# Altium schematic symbol library jlcpcb_2025_04_capacitors_extended_0201.schlib: 1175 symbols (part 1 of 7)
Pins are listed as number, name and electrical type; pins without a type are passive.

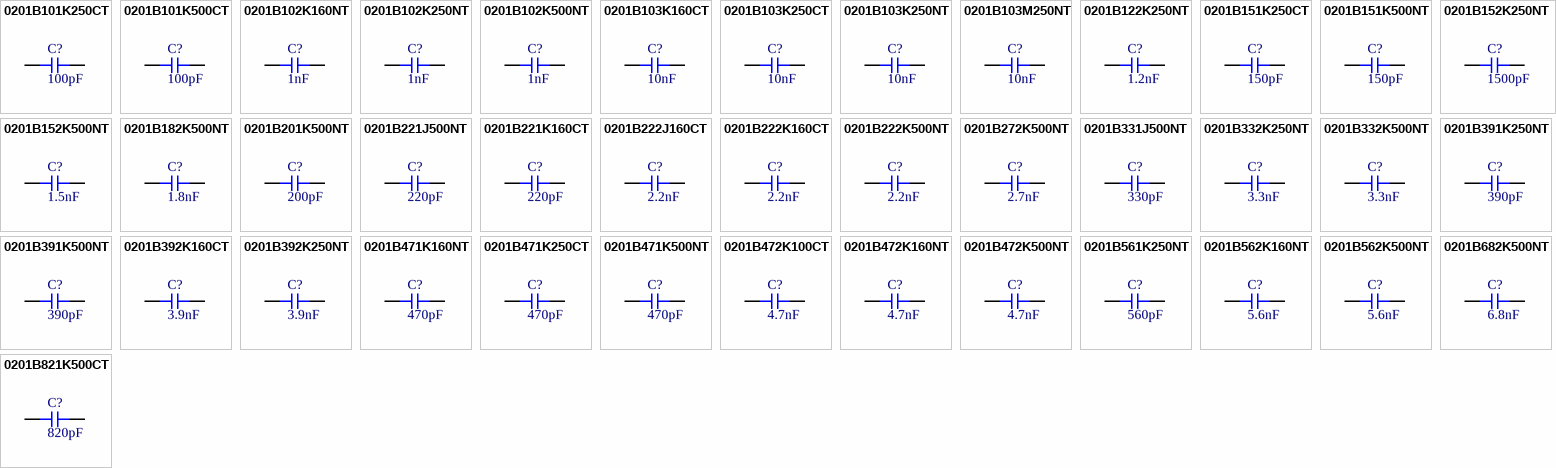
[diagram p0: symbols 0201B101K250CT to 0201B821K500CT]

## 0201B101K250CT
designator C?  Capacitance: 100pF  (hidden comment: *)
Capacitor, Ceramic (MLCC), 100pF, ±10%, 25V, X7R, ±10%, SMD 0201; Manufacturer: Walsin Tech Corp; Manufacturer Part Number: 0201B101K250CT; Package Size: 0201; JLCPCB Basic Part: No; JLCPCB Part Number: C908474; Supplier 1: LCSC; Category: Capacitors - MLCC; Supplier Part Number 1: C908474; Tolerance: ±10%; Voltage Rating: 25V; Temperature Coefficient: X7R; RoHS: Yes; ComponentLink1Description: Datasheet; ComponentLink1URL: https://wmsc.lcsc.com/wmsc/upload/file/pdf/v2/lcsc/2010271806_Walsin-Tech-Corp-0201B101K250CT_C908474.pdf; ComponentLink2Description: JLCPCB Part URL; ComponentLink2URL: https://jlcpcb.com/partdetail/C908474; ComponentLink3Description: LCSC Part URL; ComponentLink3URL: https://lcsc.com/product-detail/Multilayer-Ceramic-Capacitors-MLCC---SMD-SMT_Walsin-Tech-Corp-Walsin-Tech-Corp-0201B101K250CT_C908474.html
footprint CAP-0201 (0201 (0603M) Capacitor)
pins: 1, 2

## 0201B101K500CT
designator C?  Capacitance: 100pF  (hidden comment: *)
Capacitor, Ceramic (MLCC), 100pF, ±10%, 50V, X7R, ±10%, SMD 0201; Manufacturer: Walsin Tech Corp; Manufacturer Part Number: 0201B101K500CT; Package Size: 0201; JLCPCB Basic Part: No; JLCPCB Part Number: C295893; Supplier 1: LCSC; Category: Capacitors - MLCC; Supplier Part Number 1: C295893; Tolerance: ±10%; Voltage Rating: 50V; Temperature Coefficient: X7R; RoHS: Yes; ComponentLink1Description: Datasheet; ComponentLink1URL: https://wmsc.lcsc.com/wmsc/upload/file/pdf/v2/lcsc/2304140030_Walsin-Tech-Corp-0201B101K500CT_C295893.pdf; ComponentLink2Description: JLCPCB Part URL; ComponentLink2URL: https://jlcpcb.com/partdetail/C295893; ComponentLink3Description: LCSC Part URL; ComponentLink3URL: https://lcsc.com/product-detail/Multilayer-Ceramic-Capacitors-MLCC---SMD-SMT_Walsin-Tech-Corp-Walsin-Tech-Corp-0201B101K500CT_C295893.html
footprint CAP-0201 (0201 (0603M) Capacitor)
pins: 1, 2

## 0201B102K160NT
designator C?  Capacitance: 1nF  (hidden comment: *)
Capacitor, Ceramic (MLCC), 1nF, 16V, X7R, SMD 0201; Manufacturer: FH (Guangdong Fenghua Advanced Tech); Manufacturer Part Number: 0201B102K160NT; Package Size: 0201; JLCPCB Basic Part: No; JLCPCB Part Number: C2982963; Supplier 1: LCSC; Category: Capacitors - MLCC; Supplier Part Number 1: C2982963; Voltage Rating: 16V; Temperature Coefficient: X7R; RoHS: Yes; ComponentLink1Description: Datasheet; ComponentLink1URL: https://wmsc.lcsc.com/wmsc/upload/file/pdf/v2/lcsc/2204111630_FH--Guangdong-Fenghua-Advanced-Tech-0201B102K160NT_C2982963.pdf; ComponentLink2Description: JLCPCB Part URL; ComponentLink2URL: https://jlcpcb.com/partdetail/C2982963; ComponentLink3Description: LCSC Part URL; ComponentLink3URL: https://lcsc.com/product-detail/Multilayer-Ceramic-Capacitors-MLCC---SMD-SMT_FH-Guangdong-Fenghua-Advanced-Tech-FH-Guangdong-Fenghua-Advanced-Tech-0201B102K160NT_C2982963.html
footprint CAP-0201 (0201 (0603M) Capacitor)
pins: 1, 2

## 0201B102K250NT
designator C?  Capacitance: 1nF  (hidden comment: *)
Capacitor, Ceramic (MLCC), 1nF, ±10%, 25V, X7R, ±10%, SMD 0201; Manufacturer: FH (Guangdong Fenghua Advanced Tech); Manufacturer Part Number: 0201B102K250NT; Package Size: 0201; JLCPCB Basic Part: No; JLCPCB Part Number: C285176; Supplier 1: LCSC; Category: Capacitors - MLCC; Supplier Part Number 1: C285176; Tolerance: ±10%; Voltage Rating: 25V; Temperature Coefficient: X7R; RoHS: Yes; ComponentLink1Description: Datasheet; ComponentLink1URL: https://wmsc.lcsc.com/wmsc/upload/file/pdf/v2/lcsc/2304140030_FH--Guangdong-Fenghua-Advanced-Tech-0201B102K250NT_C285176.pdf; ComponentLink2Description: JLCPCB Part URL; ComponentLink2URL: https://jlcpcb.com/partdetail/C285176; ComponentLink3Description: LCSC Part URL; ComponentLink3URL: https://lcsc.com/product-detail/Multilayer-Ceramic-Capacitors-MLCC---SMD-SMT_FH-Guangdong-Fenghua-Advanced-Tech-FH-Guangdong-Fenghua-Advanced-Tech-0201B102K250NT_C285176.html
footprint CAP-0201 (0201 (0603M) Capacitor)
pins: 1, 2

## 0201B102K500NT
designator C?  Capacitance: 1nF  (hidden comment: *)
Capacitor, Ceramic (MLCC), 1nF, ±10%, 50V, X7R, ±10%, SMD 0201; Manufacturer: FH(Guangdong Fenghua Advanced Tech); Manufacturer Part Number: 0201B102K500NT; Package Size: 0201; JLCPCB Basic Part: No; JLCPCB Part Number: C66942; Supplier 1: LCSC; Category: Capacitors - MLCC; Supplier Part Number 1: C66942; Tolerance: ±10%; Voltage Rating: 50V; Temperature Coefficient: X7R; RoHS: Yes; ComponentLink1Description: Datasheet; ComponentLink1URL: https://wmsc.lcsc.com/wmsc/upload/file/pdf/v2/lcsc/2304140030_FH--Guangdong-Fenghua-Advanced-Tech-0201B102K500NT_C66942.pdf; ComponentLink2Description: JLCPCB Part URL; ComponentLink2URL: https://jlcpcb.com/partdetail/C66942; ComponentLink3Description: LCSC Part URL; ComponentLink3URL: https://lcsc.com/product-detail/Multilayer-Ceramic-Capacitors-MLCC---SMD-SMT_FH-Guangdong-Fenghua-Advanced-Tech-FH-Guangdong-Fenghua-Advanced-Tech-0201B102K500NT_C66942.html
footprint CAP-0201 (0201 (0603M) Capacitor)
pins: 1, 2

## 0201B103K160CT
designator C?  Capacitance: 10nF  (hidden comment: *)
Capacitor, Ceramic (MLCC), 10nF, ±10%, 16V, X7R, ±10%, SMD 0201; Manufacturer: Walsin Tech Corp; Manufacturer Part Number: 0201B103K160CT; Package Size: 0201; JLCPCB Basic Part: No; JLCPCB Part Number: C301892; Supplier 1: LCSC; Category: Capacitors - MLCC; Supplier Part Number 1: C301892; Tolerance: ±10%; Voltage Rating: 16V; Temperature Coefficient: X7R; RoHS: Yes; ComponentLink1Description: Datasheet; ComponentLink1URL: https://wmsc.lcsc.com/wmsc/upload/file/pdf/v2/lcsc/2304140030_Walsin-Tech-Corp-0201B103K160CT_C301892.pdf; ComponentLink2Description: JLCPCB Part URL; ComponentLink2URL: https://jlcpcb.com/partdetail/C301892; ComponentLink3Description: LCSC Part URL; ComponentLink3URL: https://lcsc.com/product-detail/Multilayer-Ceramic-Capacitors-MLCC---SMD-SMT_Walsin-Tech-Corp-Walsin-Tech-Corp-0201B103K160CT_C301892.html
footprint CAP-0201 (0201 (0603M) Capacitor)
pins: 1, 2

## 0201B103K250CT
designator C?  Capacitance: 10nF  (hidden comment: *)
Capacitor, Ceramic (MLCC), 10nF, ±10%, 25V, X7R, ±10%, SMD 0201; Manufacturer: Walsin Tech Corp; Manufacturer Part Number: 0201B103K250CT; Package Size: 0201; JLCPCB Basic Part: No; JLCPCB Part Number: C880757; Supplier 1: LCSC; Category: Capacitors - MLCC; Supplier Part Number 1: C880757; Tolerance: ±10%; Voltage Rating: 25V; Temperature Coefficient: X7R; RoHS: Yes; ComponentLink1Description: Datasheet; ComponentLink1URL: https://wmsc.lcsc.com/wmsc/upload/file/pdf/v2/lcsc/2304140030_Walsin-Tech-Corp-0201B103K250CT_C880757.pdf; ComponentLink2Description: JLCPCB Part URL; ComponentLink2URL: https://jlcpcb.com/partdetail/C880757; ComponentLink3Description: LCSC Part URL; ComponentLink3URL: https://lcsc.com/product-detail/Multilayer-Ceramic-Capacitors-MLCC---SMD-SMT_Walsin-Tech-Corp-Walsin-Tech-Corp-0201B103K250CT_C880757.html
footprint CAP-0201 (0201 (0603M) Capacitor)
pins: 1, 2

## 0201B103K250NT
designator C?  Capacitance: 10nF  (hidden comment: *)
Capacitor, Ceramic (MLCC), 10nF, ±10%, 25V, X7R, ±10%, SMD 0201; Manufacturer: FH(Guangdong Fenghua Advanced Tech); Manufacturer Part Number: 0201B103K250NT; Package Size: 0201; JLCPCB Basic Part: No; JLCPCB Part Number: C285010; Supplier 1: LCSC; Category: Capacitors - MLCC; Supplier Part Number 1: C285010; Tolerance: ±10%; Voltage Rating: 25V; Temperature Coefficient: X7R; RoHS: Yes; ComponentLink1Description: Datasheet; ComponentLink1URL: https://wmsc.lcsc.com/wmsc/upload/file/pdf/v2/lcsc/2304140030_FH--Guangdong-Fenghua-Advanced-Tech-0201B103K250NT_C285010.pdf; ComponentLink2Description: JLCPCB Part URL; ComponentLink2URL: https://jlcpcb.com/partdetail/C285010; ComponentLink3Description: LCSC Part URL; ComponentLink3URL: https://lcsc.com/product-detail/Multilayer-Ceramic-Capacitors-MLCC---SMD-SMT_FH-Guangdong-Fenghua-Advanced-Tech-FH-Guangdong-Fenghua-Advanced-Tech-0201B103K250NT_C285010.html
footprint CAP-0201 (0201 (0603M) Capacitor)
pins: 1, 2

## 0201B103M250NT
designator C?  Capacitance: 10nF  (hidden comment: *)
Capacitor, Ceramic (MLCC), 10nF, ±20%, 25V, X7R, ±20%, SMD 0201; Manufacturer: FH (Guangdong Fenghua Advanced Tech); Manufacturer Part Number: 0201B103M250NT; Package Size: 0201; JLCPCB Basic Part: No; JLCPCB Part Number: C301893; Supplier 1: LCSC; Category: Capacitors - MLCC; Supplier Part Number 1: C301893; Tolerance: ±20%; Voltage Rating: 25V; Temperature Coefficient: X7R; RoHS: Yes; ComponentLink1Description: Datasheet; ComponentLink1URL: https://wmsc.lcsc.com/wmsc/upload/file/pdf/v2/lcsc/2304140030_FH--Guangdong-Fenghua-Advanced-Tech-0201B103M250NT_C301893.pdf; ComponentLink2Description: JLCPCB Part URL; ComponentLink2URL: https://jlcpcb.com/partdetail/C301893; ComponentLink3Description: LCSC Part URL; ComponentLink3URL: https://lcsc.com/product-detail/Multilayer-Ceramic-Capacitors-MLCC---SMD-SMT_FH-Guangdong-Fenghua-Advanced-Tech-FH-Guangdong-Fenghua-Advanced-Tech-0201B103M250NT_C301893.html
footprint CAP-0201 (0201 (0603M) Capacitor)
pins: 1, 2

## 0201B122K250NT
designator C?  Capacitance: 1.2nF  (hidden comment: *)
Capacitor, Ceramic (MLCC), 1.2nF, ±10%, 25V, X7R, ±10%, SMD 0201; Manufacturer: FH (Guangdong Fenghua Advanced Tech); Manufacturer Part Number: 0201B122K250NT; Package Size: 0201; JLCPCB Basic Part: No; JLCPCB Part Number: C3037634; Supplier 1: LCSC; Category: Capacitors - MLCC; Supplier Part Number 1: C3037634; Tolerance: ±10%; Voltage Rating: 25V; Temperature Coefficient: X7R; RoHS: Yes; ComponentLink1Description: Datasheet; ComponentLink1URL: https://wmsc.lcsc.com/wmsc/upload/file/pdf/v2/lcsc/2206171645_FH--Guangdong-Fenghua-Advanced-Tech-0201B122K250NT_C3037634.pdf; ComponentLink2Description: JLCPCB Part URL; ComponentLink2URL: https://jlcpcb.com/partdetail/C3037634; ComponentLink3Description: LCSC Part URL; ComponentLink3URL: https://lcsc.com/product-detail/Multilayer-Ceramic-Capacitors-MLCC---SMD-SMT_FH-Guangdong-Fenghua-Advanced-Tech-FH-Guangdong-Fenghua-Advanced-Tech-0201B122K250NT_C3037634.html
footprint CAP-0201 (0201 (0603M) Capacitor)
pins: 1, 2

## 0201B151K250CT
designator C?  Capacitance: 150pF  (hidden comment: *)
Capacitor, Ceramic (MLCC), 150pF, ±10%, 25V, X7R, ±10%, SMD 0201; Manufacturer: Walsin Tech Corp; Manufacturer Part Number: 0201B151K250CT; Package Size: 0201; JLCPCB Basic Part: No; JLCPCB Part Number: C880867; Supplier 1: LCSC; Category: Capacitors - MLCC; Supplier Part Number 1: C880867; Tolerance: ±10%; Voltage Rating: 25V; Temperature Coefficient: X7R; RoHS: Yes; ComponentLink1Description: Datasheet; ComponentLink1URL: https://wmsc.lcsc.com/wmsc/upload/file/pdf/v2/lcsc/2304140030_Walsin-Tech-Corp-0201B151K250CT_C880867.pdf; ComponentLink2Description: JLCPCB Part URL; ComponentLink2URL: https://jlcpcb.com/partdetail/C880867; ComponentLink3Description: LCSC Part URL; ComponentLink3URL: https://lcsc.com/product-detail/Multilayer-Ceramic-Capacitors-MLCC---SMD-SMT_Walsin-Tech-Corp-Walsin-Tech-Corp-0201B151K250CT_C880867.html
footprint CAP-0201 (0201 (0603M) Capacitor)
pins: 1, 2

## 0201B151K500NT
designator C?  Capacitance: 150pF  (hidden comment: *)
Capacitor, Ceramic (MLCC), 150pF, ±10%, 50V, ±10%, SMD 0201; Manufacturer: FH(Guangdong Fenghua Advanced Tech); Manufacturer Part Number: 0201B151K500NT; Package Size: 0201; JLCPCB Basic Part: No; JLCPCB Part Number: C1322342; Supplier 1: LCSC; Category: Capacitors - MLCC; Supplier Part Number 1: C1322342; Tolerance: ±10%; Voltage Rating: 50V; RoHS: Yes; ComponentLink1Description: Datasheet; ComponentLink1URL: https://wmsc.lcsc.com/wmsc/upload/file/pdf/v2/lcsc/2304140030_FH--Guangdong-Fenghua-Advanced-Tech-0201B151K500NT_C1322342.pdf; ComponentLink2Description: JLCPCB Part URL; ComponentLink2URL: https://jlcpcb.com/partdetail/C1322342; ComponentLink3Description: LCSC Part URL; ComponentLink3URL: https://lcsc.com/product-detail/Multilayer-Ceramic-Capacitors-MLCC---SMD-SMT_FH-Guangdong-Fenghua-Advanced-Tech-FH-Guangdong-Fenghua-Advanced-Tech-0201B151K500NT_C1322342.html
footprint CAP-0201 (0201 (0603M) Capacitor)
pins: 1, 2

## 0201B152K250NT
designator C?  Capacitance: 1500pF  (hidden comment: *)
Capacitor, Ceramic (MLCC), 1500pF, ±10%, 25V, X7R, ±10%, SMD 0201; Manufacturer: FH (Guangdong Fenghua Advanced Tech); Manufacturer Part Number: 0201B152K250NT; Package Size: 0201; JLCPCB Basic Part: No; JLCPCB Part Number: C913865; Supplier 1: LCSC; Category: Capacitors - MLCC; Supplier Part Number 1: C913865; Tolerance: ±10%; Voltage Rating: 25V; Temperature Coefficient: X7R; RoHS: Yes; ComponentLink1Description: Datasheet; ComponentLink1URL: https://wmsc.lcsc.com/wmsc/upload/file/pdf/v2/lcsc/2304140030_FH--Guangdong-Fenghua-Advanced-Tech-0201B152K250NT_C913865.pdf; ComponentLink2Description: JLCPCB Part URL; ComponentLink2URL: https://jlcpcb.com/partdetail/C913865; ComponentLink3Description: LCSC Part URL; ComponentLink3URL: https://lcsc.com/product-detail/Multilayer-Ceramic-Capacitors-MLCC---SMD-SMT_FH-Guangdong-Fenghua-Advanced-Tech-FH-Guangdong-Fenghua-Advanced-Tech-0201B152K250NT_C913865.html
footprint CAP-0201 (0201 (0603M) Capacitor)
pins: 1, 2

## 0201B152K500NT
designator C?  Capacitance: 1.5nF  (hidden comment: *)
Capacitor, Ceramic (MLCC), 1.5nF, ±10%, 50V, X7R, ±10%, SMD 0201; Manufacturer: FH (Guangdong Fenghua Advanced Tech); Manufacturer Part Number: 0201B152K500NT; Package Size: 0201; JLCPCB Basic Part: No; JLCPCB Part Number: C285104; Supplier 1: LCSC; Category: Capacitors - MLCC; Supplier Part Number 1: C285104; Tolerance: ±10%; Voltage Rating: 50V; Temperature Coefficient: X7R; RoHS: Yes; ComponentLink1Description: Datasheet; ComponentLink1URL: https://wmsc.lcsc.com/wmsc/upload/file/pdf/v2/lcsc/2304140030_FH--Guangdong-Fenghua-Advanced-Tech-0201B152K500NT_C285104.pdf; ComponentLink2Description: JLCPCB Part URL; ComponentLink2URL: https://jlcpcb.com/partdetail/C285104; ComponentLink3Description: LCSC Part URL; ComponentLink3URL: https://lcsc.com/product-detail/Multilayer-Ceramic-Capacitors-MLCC---SMD-SMT_FH-Guangdong-Fenghua-Advanced-Tech-FH-Guangdong-Fenghua-Advanced-Tech-0201B152K500NT_C285104.html
footprint CAP-0201 (0201 (0603M) Capacitor)
pins: 1, 2

## 0201B182K500NT
designator C?  Capacitance: 1.8nF  (hidden comment: *)
Capacitor, Ceramic (MLCC), 1.8nF, 50V, SMD 0201; Manufacturer: FH (Guangdong Fenghua Advanced Tech); Manufacturer Part Number: 0201B182K500NT; Package Size: 0201; JLCPCB Basic Part: No; JLCPCB Part Number: C2857956; Supplier 1: LCSC; Category: Capacitors - MLCC; Supplier Part Number 1: C2857956; Voltage Rating: 50V; RoHS: Yes; ComponentLink1Description: Datasheet; ComponentLink2Description: JLCPCB Part URL; ComponentLink2URL: https://jlcpcb.com/partdetail/C2857956; ComponentLink3Description: LCSC Part URL; ComponentLink3URL: https://lcsc.com/product-detail/Multilayer-Ceramic-Capacitors-MLCC---SMD-SMT_FH-Guangdong-Fenghua-Advanced-Tech-FH-Guangdong-Fenghua-Advanced-Tech-0201B182K500NT_C2857956.html
footprint CAP-0201 (0201 (0603M) Capacitor)
pins: 1, 2

## 0201B201K500NT
designator C?  Capacitance: 200pF  (hidden comment: *)
Capacitor, Ceramic (MLCC), 200pF, 50V, SMD 0201; Manufacturer: FH (Guangdong Fenghua Advanced Tech); Manufacturer Part Number: 0201B201K500NT; Package Size: 0201; JLCPCB Basic Part: No; JLCPCB Part Number: C2857957; Supplier 1: LCSC; Category: Capacitors - MLCC; Supplier Part Number 1: C2857957; Voltage Rating: 50V; RoHS: Yes; ComponentLink1Description: Datasheet; ComponentLink2Description: JLCPCB Part URL; ComponentLink2URL: https://jlcpcb.com/partdetail/C2857957; ComponentLink3Description: LCSC Part URL; ComponentLink3URL: https://lcsc.com/product-detail/Multilayer-Ceramic-Capacitors-MLCC---SMD-SMT_FH-Guangdong-Fenghua-Advanced-Tech-FH-Guangdong-Fenghua-Advanced-Tech-0201B201K500NT_C2857957.html
footprint CAP-0201 (0201 (0603M) Capacitor)
pins: 1, 2

## 0201B221J500NT
designator C?  Capacitance: 220pF  (hidden comment: *)
Capacitor, Ceramic (MLCC), 220pF, 50V, SMD 0201; Manufacturer: FH (Guangdong Fenghua Advanced Tech); Manufacturer Part Number: 0201B221J500NT; Package Size: 0201; JLCPCB Basic Part: No; JLCPCB Part Number: C2857958; Supplier 1: LCSC; Category: Capacitors - MLCC; Supplier Part Number 1: C2857958; Voltage Rating: 50V; RoHS: Yes; ComponentLink1Description: Datasheet; ComponentLink2Description: JLCPCB Part URL; ComponentLink2URL: https://jlcpcb.com/partdetail/C2857958; ComponentLink3Description: LCSC Part URL; ComponentLink3URL: https://lcsc.com/product-detail/Multilayer-Ceramic-Capacitors-MLCC---SMD-SMT_FH-Guangdong-Fenghua-Advanced-Tech-FH-Guangdong-Fenghua-Advanced-Tech-0201B221J500NT_C2857958.html
footprint CAP-0201 (0201 (0603M) Capacitor)
pins: 1, 2

## 0201B221K160CT
designator C?  Capacitance: 220pF  (hidden comment: *)
Capacitor, Ceramic (MLCC), 220pF, ±10%, 16V, X7R, ±10%, SMD 0201; Manufacturer: Walsin Tech Corp; Manufacturer Part Number: 0201B221K160CT; Package Size: 0201; JLCPCB Basic Part: No; JLCPCB Part Number: C384834; Supplier 1: LCSC; Category: Capacitors - MLCC; Supplier Part Number 1: C384834; Tolerance: ±10%; Voltage Rating: 16V; Temperature Coefficient: X7R; RoHS: Yes; ComponentLink1Description: Datasheet; ComponentLink1URL: https://wmsc.lcsc.com/wmsc/upload/file/pdf/v2/lcsc/2304140030_Walsin-Tech-Corp-0201B221K160CT_C384834.pdf; ComponentLink2Description: JLCPCB Part URL; ComponentLink2URL: https://jlcpcb.com/partdetail/C384834; ComponentLink3Description: LCSC Part URL; ComponentLink3URL: https://lcsc.com/product-detail/Multilayer-Ceramic-Capacitors-MLCC---SMD-SMT_Walsin-Tech-Corp-Walsin-Tech-Corp-0201B221K160CT_C384834.html
footprint CAP-0201 (0201 (0603M) Capacitor)
pins: 1, 2

## 0201B222J160CT
designator C?  Capacitance: 2.2nF  (hidden comment: *)
Capacitor, Ceramic (MLCC), 2.2nF, ±5%, 16V, X7R, ±5%, SMD 0201; Manufacturer: Walsin Tech Corp; Manufacturer Part Number: 0201B222J160CT; Package Size: 0201; JLCPCB Basic Part: No; JLCPCB Part Number: C458607; Supplier 1: LCSC; Category: Capacitors - MLCC; Supplier Part Number 1: C458607; Tolerance: ±5%; Voltage Rating: 16V; Temperature Coefficient: X7R; RoHS: Yes; ComponentLink1Description: Datasheet; ComponentLink1URL: https://wmsc.lcsc.com/wmsc/upload/file/pdf/v2/lcsc/2304140030_Walsin-Tech-Corp-0201B222J160CT_C458607.pdf; ComponentLink2Description: JLCPCB Part URL; ComponentLink2URL: https://jlcpcb.com/partdetail/C458607; ComponentLink3Description: LCSC Part URL; ComponentLink3URL: https://lcsc.com/product-detail/Multilayer-Ceramic-Capacitors-MLCC---SMD-SMT_Walsin-Tech-Corp-Walsin-Tech-Corp-0201B222J160CT_C458607.html
footprint CAP-0201 (0201 (0603M) Capacitor)
pins: 1, 2

## 0201B222K160CT
designator C?  Capacitance: 2.2nF  (hidden comment: *)
Capacitor, Ceramic (MLCC), 2.2nF, ±10%, 16V, X7R, ±10%, SMD 0201; Manufacturer: Walsin Tech Corp; Manufacturer Part Number: 0201B222K160CT; Package Size: 0201; JLCPCB Basic Part: No; JLCPCB Part Number: C340652; Supplier 1: LCSC; Category: Capacitors - MLCC; Supplier Part Number 1: C340652; Tolerance: ±10%; Voltage Rating: 16V; Temperature Coefficient: X7R; RoHS: Yes; ComponentLink1Description: Datasheet; ComponentLink1URL: https://wmsc.lcsc.com/wmsc/upload/file/pdf/v2/lcsc/2304140030_Walsin-Tech-Corp-0201B222K160CT_C340652.pdf; ComponentLink2Description: JLCPCB Part URL; ComponentLink2URL: https://jlcpcb.com/partdetail/C340652; ComponentLink3Description: LCSC Part URL; ComponentLink3URL: https://lcsc.com/product-detail/Multilayer-Ceramic-Capacitors-MLCC---SMD-SMT_Walsin-Tech-Corp-Walsin-Tech-Corp-0201B222K160CT_C340652.html
footprint CAP-0201 (0201 (0603M) Capacitor)
pins: 1, 2

## 0201B222K500NT
designator C?  Capacitance: 2.2nF  (hidden comment: *)
Capacitor, Ceramic (MLCC), 2.2nF, ±10%, 50V, X7R, ±10%, SMD 0201; Manufacturer: FH (Guangdong Fenghua Advanced Tech); Manufacturer Part Number: 0201B222K500NT; Package Size: 0201; JLCPCB Basic Part: No; JLCPCB Part Number: C80433; Supplier 1: LCSC; Category: Capacitors - MLCC; Supplier Part Number 1: C80433; Tolerance: ±10%; Voltage Rating: 50V; Temperature Coefficient: X7R; RoHS: Yes; ComponentLink1Description: Datasheet; ComponentLink1URL: https://wmsc.lcsc.com/wmsc/upload/file/pdf/v2/lcsc/2304140030_FH--Guangdong-Fenghua-Advanced-Tech-0201B222K500NT_C80433.pdf; ComponentLink2Description: JLCPCB Part URL; ComponentLink2URL: https://jlcpcb.com/partdetail/C80433; ComponentLink3Description: LCSC Part URL; ComponentLink3URL: https://lcsc.com/product-detail/Multilayer-Ceramic-Capacitors-MLCC---SMD-SMT_FH-Guangdong-Fenghua-Advanced-Tech-FH-Guangdong-Fenghua-Advanced-Tech-0201B222K500NT_C80433.html
footprint CAP-0201 (0201 (0603M) Capacitor)
pins: 1, 2

## 0201B272K500NT
designator C?  Capacitance: 2.7nF  (hidden comment: *)
Capacitor, Ceramic (MLCC), 2.7nF, ±10%, 50V, X7R, ±10%, SMD 0201; Manufacturer: FH (Guangdong Fenghua Advanced Tech); Manufacturer Part Number: 0201B272K500NT; Package Size: 0201; JLCPCB Basic Part: No; JLCPCB Part Number: C3037620; Supplier 1: LCSC; Category: Capacitors - MLCC; Supplier Part Number 1: C3037620; Tolerance: ±10%; Voltage Rating: 50V; Temperature Coefficient: X7R; RoHS: Yes; ComponentLink1Description: Datasheet; ComponentLink1URL: https://wmsc.lcsc.com/wmsc/upload/file/pdf/v2/lcsc/2206282015_FH--Guangdong-Fenghua-Advanced-Tech-0201B272K500NT_C3037620.pdf; ComponentLink2Description: JLCPCB Part URL; ComponentLink2URL: https://jlcpcb.com/partdetail/C3037620; ComponentLink3Description: LCSC Part URL; ComponentLink3URL: https://lcsc.com/product-detail/Multilayer-Ceramic-Capacitors-MLCC---SMD-SMT_FH-Guangdong-Fenghua-Advanced-Tech-FH-Guangdong-Fenghua-Advanced-Tech-0201B272K500NT_C3037620.html
footprint CAP-0201 (0201 (0603M) Capacitor)
pins: 1, 2

## 0201B331J500NT
designator C?  Capacitance: 330pF  (hidden comment: *)
Capacitor, Ceramic (MLCC), 330pF, ±5%, 50V, X7R, ±5%, SMD 0201; Manufacturer: FH (Guangdong Fenghua Advanced Tech); Manufacturer Part Number: 0201B331J500NT; Package Size: 0201; JLCPCB Basic Part: No; JLCPCB Part Number: C2857959; Supplier 1: LCSC; Category: Capacitors - MLCC; Supplier Part Number 1: C2857959; Tolerance: ±5%; Voltage Rating: 50V; Temperature Coefficient: X7R; RoHS: Yes; ComponentLink1Description: Datasheet; ComponentLink2Description: JLCPCB Part URL; ComponentLink2URL: https://jlcpcb.com/partdetail/C2857959; ComponentLink3Description: LCSC Part URL; ComponentLink3URL: https://lcsc.com/product-detail/Multilayer-Ceramic-Capacitors-MLCC---SMD-SMT_FH-Guangdong-Fenghua-Advanced-Tech-FH-Guangdong-Fenghua-Advanced-Tech-0201B331J500NT_C2857959.html
footprint CAP-0201 (0201 (0603M) Capacitor)
pins: 1, 2

## 0201B332K250NT
designator C?  Capacitance: 3.3nF  (hidden comment: *)
Capacitor, Ceramic (MLCC), 3.3nF, ±10%, 25V, X7R, ±10%, SMD 0201; Manufacturer: FH (Guangdong Fenghua Advanced Tech); Manufacturer Part Number: 0201B332K250NT; Package Size: 0201; JLCPCB Basic Part: No; JLCPCB Part Number: C3037621; Supplier 1: LCSC; Category: Capacitors - MLCC; Supplier Part Number 1: C3037621; Tolerance: ±10%; Voltage Rating: 25V; Temperature Coefficient: X7R; RoHS: Yes; ComponentLink1Description: Datasheet; ComponentLink1URL: https://wmsc.lcsc.com/wmsc/upload/file/pdf/v2/lcsc/2206282015_FH--Guangdong-Fenghua-Advanced-Tech-0201B332K250NT_C3037621.pdf; ComponentLink2Description: JLCPCB Part URL; ComponentLink2URL: https://jlcpcb.com/partdetail/C3037621; ComponentLink3Description: LCSC Part URL; ComponentLink3URL: https://lcsc.com/product-detail/Multilayer-Ceramic-Capacitors-MLCC---SMD-SMT_FH-Guangdong-Fenghua-Advanced-Tech-FH-Guangdong-Fenghua-Advanced-Tech-0201B332K250NT_C3037621.html
footprint CAP-0201 (0201 (0603M) Capacitor)
pins: 1, 2

## 0201B332K500NT
designator C?  Capacitance: 3.3nF  (hidden comment: *)
Capacitor, Ceramic (MLCC), 3.3nF, ±10%, 50V, X7R, ±10%, SMD 0201; Manufacturer: FH (Guangdong Fenghua Advanced Tech); Manufacturer Part Number: 0201B332K500NT; Package Size: 0201; JLCPCB Basic Part: No; JLCPCB Part Number: C285110; Supplier 1: LCSC; Category: Capacitors - MLCC; Supplier Part Number 1: C285110; Tolerance: ±10%; Voltage Rating: 50V; Temperature Coefficient: X7R; RoHS: Yes; ComponentLink1Description: Datasheet; ComponentLink1URL: https://wmsc.lcsc.com/wmsc/upload/file/pdf/v2/lcsc/2304140030_FH--Guangdong-Fenghua-Advanced-Tech-0201B332K500NT_C285110.pdf; ComponentLink2Description: JLCPCB Part URL; ComponentLink2URL: https://jlcpcb.com/partdetail/C285110; ComponentLink3Description: LCSC Part URL; ComponentLink3URL: https://lcsc.com/product-detail/Multilayer-Ceramic-Capacitors-MLCC---SMD-SMT_FH-Guangdong-Fenghua-Advanced-Tech-FH-Guangdong-Fenghua-Advanced-Tech-0201B332K500NT_C285110.html
footprint CAP-0201 (0201 (0603M) Capacitor)
pins: 1, 2

## 0201B391K250NT
designator C?  Capacitance: 390pF  (hidden comment: *)
Capacitor, Ceramic (MLCC), 390pF, ±10%, 25V, X7R, ±10%, SMD 0201; Manufacturer: FH (Guangdong Fenghua Advanced Tech); Manufacturer Part Number: 0201B391K250NT; Package Size: 0201; JLCPCB Basic Part: No; JLCPCB Part Number: C2991595; Supplier 1: LCSC; Category: Capacitors - MLCC; Supplier Part Number 1: C2991595; Tolerance: ±10%; Voltage Rating: 25V; Temperature Coefficient: X7R; RoHS: Yes; ComponentLink1Description: Datasheet; ComponentLink1URL: https://wmsc.lcsc.com/wmsc/upload/file/pdf/v2/lcsc/2204111630_FH--Guangdong-Fenghua-Advanced-Tech-0201B391K250NT_C2991595.pdf; ComponentLink2Description: JLCPCB Part URL; ComponentLink2URL: https://jlcpcb.com/partdetail/C2991595; ComponentLink3Description: LCSC Part URL; ComponentLink3URL: https://lcsc.com/product-detail/Multilayer-Ceramic-Capacitors-MLCC---SMD-SMT_FH-Guangdong-Fenghua-Advanced-Tech-FH-Guangdong-Fenghua-Advanced-Tech-0201B391K250NT_C2991595.html
footprint CAP-0201 (0201 (0603M) Capacitor)
pins: 1, 2

## 0201B391K500NT
designator C?  Capacitance: 390pF  (hidden comment: *)
Capacitor, Ceramic (MLCC), 390pF, ±10%, 50V, X7R, ±10%, SMD 0201; Manufacturer: FH (Guangdong Fenghua Advanced Tech); Manufacturer Part Number: 0201B391K500NT; Package Size: 0201; JLCPCB Basic Part: No; JLCPCB Part Number: C507065; Supplier 1: LCSC; Category: Capacitors - MLCC; Supplier Part Number 1: C507065; Tolerance: ±10%; Voltage Rating: 50V; Temperature Coefficient: X7R; RoHS: Yes; ComponentLink1Description: Datasheet; ComponentLink1URL: https://wmsc.lcsc.com/wmsc/upload/file/pdf/v2/lcsc/2304140030_FH--Guangdong-Fenghua-Advanced-Tech-0201B391K500NT_C507065.pdf; ComponentLink2Description: JLCPCB Part URL; ComponentLink2URL: https://jlcpcb.com/partdetail/C507065; ComponentLink3Description: LCSC Part URL; ComponentLink3URL: https://lcsc.com/product-detail/Multilayer-Ceramic-Capacitors-MLCC---SMD-SMT_FH-Guangdong-Fenghua-Advanced-Tech-FH-Guangdong-Fenghua-Advanced-Tech-0201B391K500NT_C507065.html
footprint CAP-0201 (0201 (0603M) Capacitor)
pins: 1, 2

## 0201B392K160CT
designator C?  Capacitance: 3.9nF  (hidden comment: *)
Capacitor, Ceramic (MLCC), 3.9nF, ±10%, 16V, X7R, ±10%, SMD 0201; Manufacturer: Walsin Tech Corp; Manufacturer Part Number: 0201B392K160CT; Package Size: 0201; JLCPCB Basic Part: No; JLCPCB Part Number: C387910; Supplier 1: LCSC; Category: Capacitors - MLCC; Supplier Part Number 1: C387910; Tolerance: ±10%; Voltage Rating: 16V; Temperature Coefficient: X7R; RoHS: Yes; ComponentLink1Description: Datasheet; ComponentLink1URL: https://wmsc.lcsc.com/wmsc/upload/file/pdf/v2/lcsc/2304140030_Walsin-Tech-Corp-0201B392K160CT_C387910.pdf; ComponentLink2Description: JLCPCB Part URL; ComponentLink2URL: https://jlcpcb.com/partdetail/C387910; ComponentLink3Description: LCSC Part URL; ComponentLink3URL: https://lcsc.com/product-detail/Multilayer-Ceramic-Capacitors-MLCC---SMD-SMT_Walsin-Tech-Corp-Walsin-Tech-Corp-0201B392K160CT_C387910.html
footprint CAP-0201 (0201 (0603M) Capacitor)
pins: 1, 2

## 0201B392K250NT
designator C?  Capacitance: 3.9nF  (hidden comment: *)
Capacitor, Ceramic (MLCC), 3.9nF, ±10%, 25V, X7R, ±10%, SMD 0201; Manufacturer: FH (Guangdong Fenghua Advanced Tech); Manufacturer Part Number: 0201B392K250NT; Package Size: 0201; JLCPCB Basic Part: No; JLCPCB Part Number: C285046; Supplier 1: LCSC; Category: Capacitors - MLCC; Supplier Part Number 1: C285046; Tolerance: ±10%; Voltage Rating: 25V; Temperature Coefficient: X7R; RoHS: Yes; ComponentLink1Description: Datasheet; ComponentLink1URL: https://wmsc.lcsc.com/wmsc/upload/file/pdf/v2/lcsc/2304140030_FH--Guangdong-Fenghua-Advanced-Tech-0201B392K250NT_C285046.pdf; ComponentLink2Description: JLCPCB Part URL; ComponentLink2URL: https://jlcpcb.com/partdetail/C285046; ComponentLink3Description: LCSC Part URL; ComponentLink3URL: https://lcsc.com/product-detail/Multilayer-Ceramic-Capacitors-MLCC---SMD-SMT_FH-Guangdong-Fenghua-Advanced-Tech-FH-Guangdong-Fenghua-Advanced-Tech-0201B392K250NT_C285046.html
footprint CAP-0201 (0201 (0603M) Capacitor)
pins: 1, 2

## 0201B471K160NT
designator C?  Capacitance: 470pF  (hidden comment: *)
Capacitor, Ceramic (MLCC), 470pF, ±10%, 16V, X7R, ±10%, SMD 0201; Manufacturer: FH (Guangdong Fenghua Advanced Tech); Manufacturer Part Number: 0201B471K160NT; Package Size: 0201; JLCPCB Basic Part: No; JLCPCB Part Number: C913868; Supplier 1: LCSC; Category: Capacitors - MLCC; Supplier Part Number 1: C913868; Tolerance: ±10%; Voltage Rating: 16V; Temperature Coefficient: X7R; RoHS: Yes; ComponentLink1Description: Datasheet; ComponentLink1URL: https://wmsc.lcsc.com/wmsc/upload/file/pdf/v2/lcsc/2304140030_FH--Guangdong-Fenghua-Advanced-Tech-0201B471K160NT_C913868.pdf; ComponentLink2Description: JLCPCB Part URL; ComponentLink2URL: https://jlcpcb.com/partdetail/C913868; ComponentLink3Description: LCSC Part URL; ComponentLink3URL: https://lcsc.com/product-detail/Multilayer-Ceramic-Capacitors-MLCC---SMD-SMT_FH-Guangdong-Fenghua-Advanced-Tech-FH-Guangdong-Fenghua-Advanced-Tech-0201B471K160NT_C913868.html
footprint CAP-0201 (0201 (0603M) Capacitor)
pins: 1, 2

## 0201B471K250CT
designator C?  Capacitance: 470pF  (hidden comment: *)
Capacitor, Ceramic (MLCC), 470pF, ±10%, 25V, X7R, ±10%, SMD 0201; Manufacturer: Walsin Tech Corp; Manufacturer Part Number: 0201B471K250CT; Package Size: 0201; JLCPCB Basic Part: No; JLCPCB Part Number: C384831; Supplier 1: LCSC; Category: Capacitors - MLCC; Supplier Part Number 1: C384831; Tolerance: ±10%; Voltage Rating: 25V; Temperature Coefficient: X7R; RoHS: Yes; ComponentLink1Description: Datasheet; ComponentLink1URL: https://wmsc.lcsc.com/wmsc/upload/file/pdf/v2/lcsc/2201242230_Walsin-Tech-Corp-0201B471K250CT_C384831.pdf; ComponentLink2Description: JLCPCB Part URL; ComponentLink2URL: https://jlcpcb.com/partdetail/C384831; ComponentLink3Description: LCSC Part URL; ComponentLink3URL: https://lcsc.com/product-detail/Multilayer-Ceramic-Capacitors-MLCC---SMD-SMT_Walsin-Tech-Corp-Walsin-Tech-Corp-0201B471K250CT_C384831.html
footprint CAP-0201 (0201 (0603M) Capacitor)
pins: 1, 2

## 0201B471K500NT
designator C?  Capacitance: 470pF  (hidden comment: *)
Capacitor, Ceramic (MLCC), 470pF, ±10%, 50V, X7R, ±10%, SMD 0201; Manufacturer: FH (Guangdong Fenghua Advanced Tech); Manufacturer Part Number: 0201B471K500NT; Package Size: 0201; JLCPCB Basic Part: No; JLCPCB Part Number: C55020; Supplier 1: LCSC; Category: Capacitors - MLCC; Supplier Part Number 1: C55020; Tolerance: ±10%; Voltage Rating: 50V; Temperature Coefficient: X7R; RoHS: Yes; ComponentLink1Description: Datasheet; ComponentLink1URL: https://wmsc.lcsc.com/wmsc/upload/file/pdf/v2/lcsc/2304140030_FH--Guangdong-Fenghua-Advanced-Tech-0201B471K500NT_C55020.pdf; ComponentLink2Description: JLCPCB Part URL; ComponentLink2URL: https://jlcpcb.com/partdetail/C55020; ComponentLink3Description: LCSC Part URL; ComponentLink3URL: https://lcsc.com/product-detail/Multilayer-Ceramic-Capacitors-MLCC---SMD-SMT_FH-Guangdong-Fenghua-Advanced-Tech-FH-Guangdong-Fenghua-Advanced-Tech-0201B471K500NT_C55020.html
footprint CAP-0201 (0201 (0603M) Capacitor)
pins: 1, 2

## 0201B472K100CT
designator C?  Capacitance: 4.7nF  (hidden comment: *)
Capacitor, Ceramic (MLCC), 4.7nF, ±10%, 10V, X7R, ±10%, SMD 0201; Manufacturer: Walsin Tech Corp; Manufacturer Part Number: 0201B472K100CT; Package Size: 0201; JLCPCB Basic Part: No; JLCPCB Part Number: C396693; Supplier 1: LCSC; Category: Capacitors - MLCC; Supplier Part Number 1: C396693; Tolerance: ±10%; Voltage Rating: 10V; Temperature Coefficient: X7R; RoHS: Yes; ComponentLink1Description: Datasheet; ComponentLink1URL: https://wmsc.lcsc.com/wmsc/upload/file/pdf/v2/lcsc/2304140030_Walsin-Tech-Corp-0201B472K100CT_C396693.pdf; ComponentLink2Description: JLCPCB Part URL; ComponentLink2URL: https://jlcpcb.com/partdetail/C396693; ComponentLink3Description: LCSC Part URL; ComponentLink3URL: https://lcsc.com/product-detail/Multilayer-Ceramic-Capacitors-MLCC---SMD-SMT_Walsin-Tech-Corp-Walsin-Tech-Corp-0201B472K100CT_C396693.html
footprint CAP-0201 (0201 (0603M) Capacitor)
pins: 1, 2

## 0201B472K160NT
designator C?  Capacitance: 4.7nF  (hidden comment: *)
Capacitor, Ceramic (MLCC), 4.7nF, ±10%, 16V, X7R, ±10%, SMD 0201; Manufacturer: FH (Guangdong Fenghua Advanced Tech); Manufacturer Part Number: 0201B472K160NT; Package Size: 0201; JLCPCB Basic Part: No; JLCPCB Part Number: C336629; Supplier 1: LCSC; Category: Capacitors - MLCC; Supplier Part Number 1: C336629; Tolerance: ±10%; Voltage Rating: 16V; Temperature Coefficient: X7R; RoHS: Yes; ComponentLink1Description: Datasheet; ComponentLink1URL: https://wmsc.lcsc.com/wmsc/upload/file/pdf/v2/lcsc/2304140030_FH--Guangdong-Fenghua-Advanced-Tech-0201B472K160NT_C336629.pdf; ComponentLink2Description: JLCPCB Part URL; ComponentLink2URL: https://jlcpcb.com/partdetail/C336629; ComponentLink3Description: LCSC Part URL; ComponentLink3URL: https://lcsc.com/product-detail/Multilayer-Ceramic-Capacitors-MLCC---SMD-SMT_FH-Guangdong-Fenghua-Advanced-Tech-FH-Guangdong-Fenghua-Advanced-Tech-0201B472K160NT_C336629.html
footprint CAP-0201 (0201 (0603M) Capacitor)
pins: 1, 2

## 0201B472K500NT
designator C?  Capacitance: 4.7nF  (hidden comment: *)
Capacitor, Ceramic (MLCC), 4.7nF, ±10%, 50V, X7R, ±10%, SMD 0201; Manufacturer: FH (Guangdong Fenghua Advanced Tech); Manufacturer Part Number: 0201B472K500NT; Package Size: 0201; JLCPCB Basic Part: No; JLCPCB Part Number: C66943; Supplier 1: LCSC; Category: Capacitors - MLCC; Supplier Part Number 1: C66943; Tolerance: ±10%; Voltage Rating: 50V; Temperature Coefficient: X7R; RoHS: Yes; ComponentLink1Description: Datasheet; ComponentLink1URL: https://wmsc.lcsc.com/wmsc/upload/file/pdf/v2/lcsc/2304140030_FH--Guangdong-Fenghua-Advanced-Tech-0201B472K500NT_C66943.pdf; ComponentLink2Description: JLCPCB Part URL; ComponentLink2URL: https://jlcpcb.com/partdetail/C66943; ComponentLink3Description: LCSC Part URL; ComponentLink3URL: https://lcsc.com/product-detail/Multilayer-Ceramic-Capacitors-MLCC---SMD-SMT_FH-Guangdong-Fenghua-Advanced-Tech-FH-Guangdong-Fenghua-Advanced-Tech-0201B472K500NT_C66943.html
footprint CAP-0201 (0201 (0603M) Capacitor)
pins: 1, 2

## 0201B561K250NT
designator C?  Capacitance: 560pF  (hidden comment: *)
Capacitor, Ceramic (MLCC), 560pF, ±10%, 25V, X7R, ±10%, SMD 0201; Manufacturer: FH(Guangdong Fenghua Advanced Tech); Manufacturer Part Number: 0201B561K250NT; Package Size: 0201; JLCPCB Basic Part: No; JLCPCB Part Number: C284985; Supplier 1: LCSC; Category: Capacitors - MLCC; Supplier Part Number 1: C284985; Tolerance: ±10%; Voltage Rating: 25V; Temperature Coefficient: X7R; RoHS: Yes; ComponentLink1Description: Datasheet; ComponentLink1URL: https://wmsc.lcsc.com/wmsc/upload/file/pdf/v2/lcsc/2304140030_FH--Guangdong-Fenghua-Advanced-Tech-0201B561K250NT_C284985.pdf; ComponentLink2Description: JLCPCB Part URL; ComponentLink2URL: https://jlcpcb.com/partdetail/C284985; ComponentLink3Description: LCSC Part URL; ComponentLink3URL: https://lcsc.com/product-detail/Multilayer-Ceramic-Capacitors-MLCC---SMD-SMT_FH-Guangdong-Fenghua-Advanced-Tech-FH-Guangdong-Fenghua-Advanced-Tech-0201B561K250NT_C284985.html
footprint CAP-0201 (0201 (0603M) Capacitor)
pins: 1, 2

## 0201B562K160NT
designator C?  Capacitance: 5.6nF  (hidden comment: *)
Capacitor, Ceramic (MLCC), 5.6nF, ±10%, 16V, ±10%, SMD 0201; Manufacturer: FH(Guangdong Fenghua Advanced Tech); Manufacturer Part Number: 0201B562K160NT; Package Size: 0201; JLCPCB Basic Part: No; JLCPCB Part Number: C1322343; Supplier 1: LCSC; Category: Capacitors - MLCC; Supplier Part Number 1: C1322343; Tolerance: ±10%; Voltage Rating: 16V; RoHS: Yes; ComponentLink1Description: Datasheet; ComponentLink1URL: https://wmsc.lcsc.com/wmsc/upload/file/pdf/v2/lcsc/2304140030_FH--Guangdong-Fenghua-Advanced-Tech-0201B562K160NT_C1322343.pdf; ComponentLink2Description: JLCPCB Part URL; ComponentLink2URL: https://jlcpcb.com/partdetail/C1322343; ComponentLink3Description: LCSC Part URL; ComponentLink3URL: https://lcsc.com/product-detail/Multilayer-Ceramic-Capacitors-MLCC---SMD-SMT_FH-Guangdong-Fenghua-Advanced-Tech-FH-Guangdong-Fenghua-Advanced-Tech-0201B562K160NT_C1322343.html
footprint CAP-0201 (0201 (0603M) Capacitor)
pins: 1, 2

## 0201B562K500NT
designator C?  Capacitance: 5.6nF  (hidden comment: *)
Capacitor, Ceramic (MLCC), 5.6nF, ±10%, 50V, X7R, ±10%, SMD 0201; Manufacturer: FH (Guangdong Fenghua Advanced Tech); Manufacturer Part Number: 0201B562K500NT; Package Size: 0201; JLCPCB Basic Part: No; JLCPCB Part Number: C3037635; Supplier 1: LCSC; Category: Capacitors - MLCC; Supplier Part Number 1: C3037635; Tolerance: ±10%; Voltage Rating: 50V; Temperature Coefficient: X7R; RoHS: Yes; ComponentLink1Description: Datasheet; ComponentLink1URL: https://wmsc.lcsc.com/wmsc/upload/file/pdf/v2/lcsc/2206171645_FH--Guangdong-Fenghua-Advanced-Tech-0201B562K500NT_C3037635.pdf; ComponentLink2Description: JLCPCB Part URL; ComponentLink2URL: https://jlcpcb.com/partdetail/C3037635; ComponentLink3Description: LCSC Part URL; ComponentLink3URL: https://lcsc.com/product-detail/Multilayer-Ceramic-Capacitors-MLCC---SMD-SMT_FH-Guangdong-Fenghua-Advanced-Tech-FH-Guangdong-Fenghua-Advanced-Tech-0201B562K500NT_C3037635.html
footprint CAP-0201 (0201 (0603M) Capacitor)
pins: 1, 2

## 0201B682K500NT
designator C?  Capacitance: 6.8nF  (hidden comment: *)
Capacitor, Ceramic (MLCC), 6.8nF, ±10%, 50V, ±10%, SMD 0201; Manufacturer: FH(Guangdong Fenghua Advanced Tech); Manufacturer Part Number: 0201B682K500NT; Package Size: 0201; JLCPCB Basic Part: No; JLCPCB Part Number: C285015; Supplier 1: LCSC; Category: Capacitors - MLCC; Supplier Part Number 1: C285015; Tolerance: ±10%; Voltage Rating: 50V; RoHS: Yes; ComponentLink1Description: Datasheet; ComponentLink1URL: https://wmsc.lcsc.com/wmsc/upload/file/pdf/v2/lcsc/2107272240_FH--Guangdong-Fenghua-Advanced-Tech-0201B682K500NT_C285015.pdf; ComponentLink2Description: JLCPCB Part URL; ComponentLink2URL: https://jlcpcb.com/partdetail/C285015; ComponentLink3Description: LCSC Part URL; ComponentLink3URL: https://lcsc.com/product-detail/Multilayer-Ceramic-Capacitors-MLCC---SMD-SMT_FH-Guangdong-Fenghua-Advanced-Tech-FH-Guangdong-Fenghua-Advanced-Tech-0201B682K500NT_C285015.html
footprint CAP-0201 (0201 (0603M) Capacitor)
pins: 1, 2

## 0201B821K500CT
designator C?  Capacitance: 820pF  (hidden comment: *)
Capacitor, Ceramic (MLCC), 820pF, ±10%, 50V, X7R, ±10%, SMD 0201; Manufacturer: Walsin Tech Corp; Manufacturer Part Number: 0201B821K500CT; Package Size: 0201; JLCPCB Basic Part: No; JLCPCB Part Number: C3857765; Supplier 1: LCSC; Category: Capacitors - MLCC; Supplier Part Number 1: C3857765; Tolerance: ±10%; Voltage Rating: 50V; Temperature Coefficient: X7R; RoHS: Yes; ComponentLink1Description: Datasheet; ComponentLink1URL: https://wmsc.lcsc.com/wmsc/upload/file/pdf/v2/lcsc/2309201533_Walsin-Tech-Corp-0201B821K500CT_C3857765.pdf; ComponentLink2Description: JLCPCB Part URL; ComponentLink2URL: https://jlcpcb.com/partdetail/C3857765; ComponentLink3Description: LCSC Part URL; ComponentLink3URL: https://lcsc.com/product-detail/Multilayer-Ceramic-Capacitors-MLCC---SMD-SMT_Walsin-Tech-Corp-Walsin-Tech-Corp-0201B821K500CT_C3857765.html
footprint CAP-0201 (0201 (0603M) Capacitor)
pins: 1, 2

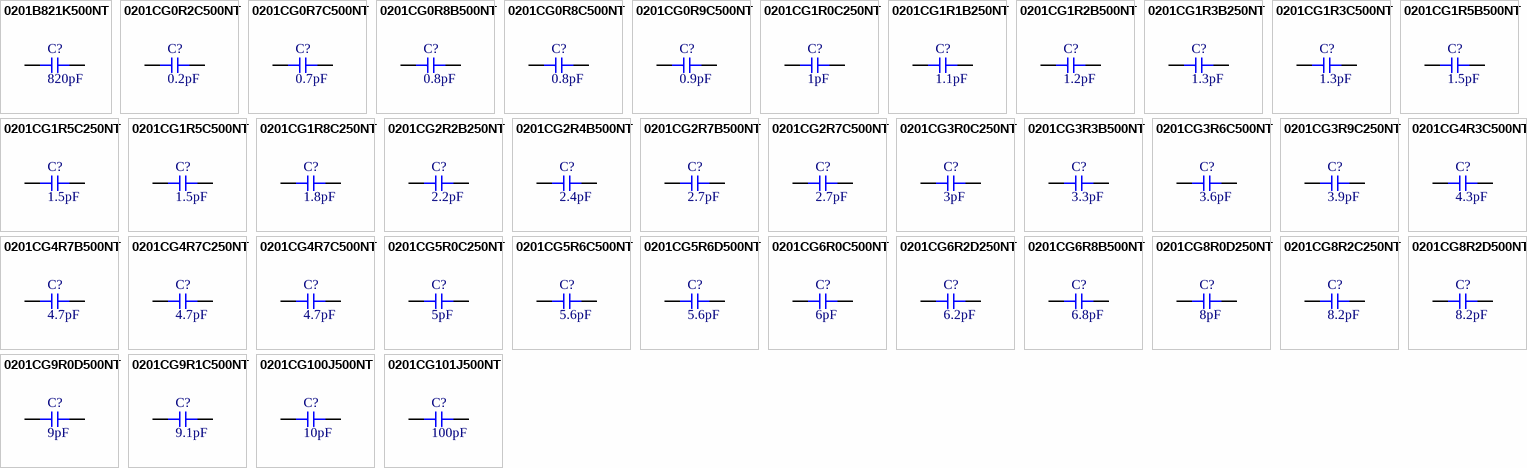
[diagram p1: symbols 0201B821K500NT to 0201CG101J500NT]

## 0201B821K500NT
designator C?  Capacitance: 820pF  (hidden comment: *)
Capacitor, Ceramic (MLCC), 820pF, 50V, SMD 0201; Manufacturer: FH(Guangdong Fenghua Advanced Tech); Manufacturer Part Number: 0201B821K500NT; Package Size: 0201; JLCPCB Basic Part: No; JLCPCB Part Number: C2836759; Supplier 1: LCSC; Category: Capacitors - MLCC; Supplier Part Number 1: C2836759; Voltage Rating: 50V; RoHS: Yes; ComponentLink1Description: Datasheet; ComponentLink1URL: https://wmsc.lcsc.com/wmsc/upload/file/pdf/v2/lcsc/2304140030_FH--Guangdong-Fenghua-Advanced-Tech-0201B821K500NT_C2836759.pdf; ComponentLink2Description: JLCPCB Part URL; ComponentLink2URL: https://jlcpcb.com/partdetail/C2836759; ComponentLink3Description: LCSC Part URL; ComponentLink3URL: https://lcsc.com/product-detail/Multilayer-Ceramic-Capacitors-MLCC---SMD-SMT_FH-Guangdong-Fenghua-Advanced-Tech-FH-Guangdong-Fenghua-Advanced-Tech-0201B821K500NT_C2836759.html
footprint CAP-0201 (0201 (0603M) Capacitor)
pins: 1, 2
